# Altium footprint library 镙丝套件.PcbLib: 33 footprints (part 3 of 3)
Each footprint in its own frame and in the unit in brackets; x right, y up, seen from the top. Pads: shape width x height; smd on the part's side, far side on the other; paste and mask are expansions set on the pad; w line width, h text height; cw(c..) or ccw(c..) is an arc to the next point about the centre after c.
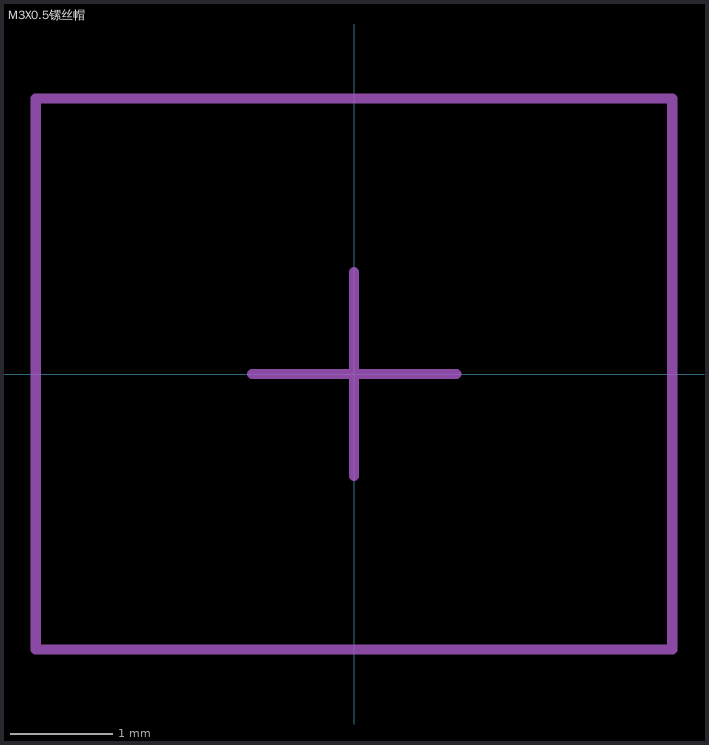
[diagram p2: the footprint, top view; thin cyan lines are the x and y axes]

## M3X0.5镙丝帽 [mm] "M3镙丝帽"
height 2.54
Mechanical 13:
  lines w0.1: -3.119,-2.7 -3.119,2.7 3.116,2.7 3.116,-2.7 -3.119,-2.7
Mechanical 15:
  lines w0.1: -1,0 1,0 ; 0,-1 0,1
3D body: height 2.4, standoff 0, extent -3.119,-2.7 3.116,2.7